# Altium footprint library NXP_60_26022015.PCBLIB: 287 footprints (part 13 of 18) (continued)
## SOT926-1 [mm]
pads (100):
  rrect100% 0.35x0.35 smd: A1(-3.6,3.6) A2(-2.8,3.6) A3(-2,3.6) A4(-1.2,3.6) A5(-0.4,3.6) A6(0.4,3.6) A7(1.2,3.6) A8(2,3.6) A9(2.8,3.6) A10(3.6,3.6) B1(-3.6,2.8) B2(-2.8,2.8) B3(-2,2.8) B4(-1.2,2.8) B5(-0.4,2.8) B6(0.4,2.8) B7(1.2,2.8) B8(2,2.8) B9(2.8,2.8) B10(3.6,2.8) C1(-3.6,2) C2(-2.8,2) C3(-2,2) C4(-1.2,2) C5(-0.4,2) C6(0.4,2) C7(1.2,2) C8(2,2) C9(2.8,2) C10(3.6,2) D1(-3.6,1.2) D2(-2.8,1.2) D3(-2,1.2) D4(-1.2,1.2) D5(-0.4,1.2) D6(0.4,1.2) D7(1.2,1.2) D8(2,1.2) D9(2.8,1.2) D10(3.6,1.2) E1(-3.6,0.4) E2(-2.8,0.4) E3(-2,0.4) E4(-1.2,0.4) E5(-0.4,0.4) E6(0.4,0.4) E7(1.2,0.4) E8(2,0.4) E9(2.8,0.4) E10(3.6,0.4) F1(-3.6,-0.4) F2(-2.8,-0.4) F3(-2,-0.4) F4(-1.2,-0.4) F5(-0.4,-0.4) F6(0.4,-0.4) F7(1.2,-0.4) F8(2,-0.4) F9(2.8,-0.4) F10(3.6,-0.4) G1(-3.6,-1.2) G2(-2.8,-1.2) G3(-2,-1.2) G4(-1.2,-1.2) G5(-0.4,-1.2) G6(0.4,-1.2) G7(1.2,-1.2) G8(2,-1.2) G9(2.8,-1.2) G10(3.6,-1.2) H1(-3.6,-2) H2(-2.8,-2) H3(-2,-2) H4(-1.2,-2) H5(-0.4,-2) H6(0.4,-2) H7(1.2,-2) H8(2,-2) H9(2.8,-2) H10(3.6,-2) J1(-3.6,-2.8) J2(-2.8,-2.8) J3(-2,-2.8) J4(-1.2,-2.8) J5(-0.4,-2.8) J6(0.4,-2.8) J7(1.2,-2.8) J8(2,-2.8) J9(2.8,-2.8) J10(3.6,-2.8) K1(-3.6,-3.6) K2(-2.8,-3.6) K3(-2,-3.6) K4(-1.2,-3.6) K5(-0.4,-3.6) K6(0.4,-3.6) K7(1.2,-3.6) K8(2,-3.6) K9(2.8,-3.6) K10(3.6,-3.6)
Top Overlay:
  lines w0.127: -5.25,4 -5.25,5.25 -4,5.25 ; -5,-5 5,-5 5,5 -5,5 -5,-5
Top Paste:
  circle w0: c0.4,-2 r0.175
  circle w0: c-0.4,-2 r0.175
  circle w0: c0.4,-1.2 r0.175
  circle w0: c-0.4,-1.2 r0.175
  circle w0: c0.4,-3.6 r0.175
  circle w0: c-0.4,-3.6 r0.175
  circle w0: c0.4,-2.8 r0.175
  circle w0: c-0.4,-2.8 r0.175
  circle w0: c-1.2,-2 r0.175
  circle w0: c-2,-2 r0.175
  circle w0: c-1.2,-1.2 r0.175
  circle w0: c-2,-1.2 r0.175
  circle w0: c-1.2,-3.6 r0.175
  circle w0: c-2,-3.6 r0.175
  circle w0: c-1.2,-2.8 r0.175
  circle w0: c-2,-2.8 r0.175
  circle w0: c3.6,-2 r0.175
  circle w0: c2.8,-2 r0.175
  circle w0: c3.6,-1.2 r0.175
  circle w0: c2.8,-1.2 r0.175
  circle w0: c3.6,-3.6 r0.175
  circle w0: c2.8,-3.6 r0.175
  circle w0: c3.6,-2.8 r0.175
  circle w0: c2.8,-2.8 r0.175
  circle w0: c2,-2 r0.175
  circle w0: c1.2,-2 r0.175
  circle w0: c2,-1.2 r0.175
  circle w0: c1.2,-1.2 r0.175
  circle w0: c2,-3.6 r0.175
  circle w0: c1.2,-3.6 r0.175
  circle w0: c2,-2.8 r0.175
  circle w0: c1.2,-2.8 r0.175
  circle w0: c-2.8,-2 r0.175
  circle w0: c-3.6,-2 r0.175
  circle w0: c-2.8,-1.2 r0.175
  circle w0: c-3.6,-1.2 r0.175
  circle w0: c-2.8,-3.6 r0.175
  circle w0: c-3.6,-3.6 r0.175
  circle w0: c-2.8,-2.8 r0.175
  circle w0: c-3.6,-2.8 r0.175
  circle w0: c0.4,1.2 r0.175
  circle w0: c-0.4,1.2 r0.175
  circle w0: c0.4,2 r0.175
  circle w0: c-0.4,2 r0.175
  circle w0: c0.4,-0.4 r0.175
  circle w0: c-0.4,-0.4 r0.175
  circle w0: c0.4,0.4 r0.175
  circle w0: c-0.4,0.4 r0.175
  circle w0: c-1.2,1.2 r0.175
  circle w0: c-2,1.2 r0.175
  circle w0: c-1.2,2 r0.175
  circle w0: c-2,2 r0.175
  circle w0: c-1.2,-0.4 r0.175
  circle w0: c-2,-0.4 r0.175
  circle w0: c-1.2,0.4 r0.175
  circle w0: c-2,0.4 r0.175
  circle w0: c3.6,1.2 r0.175
  circle w0: c2.8,1.2 r0.175
  circle w0: c3.6,2 r0.175
  circle w0: c2.8,2 r0.175
  circle w0: c3.6,-0.4 r0.175
  circle w0: c2.8,-0.4 r0.175
  circle w0: c3.6,0.4 r0.175
  circle w0: c2.8,0.4 r0.175
  circle w0: c2,1.2 r0.175
  circle w0: c1.2,1.2 r0.175
  circle w0: c2,2 r0.175
  circle w0: c1.2,2 r0.175
  circle w0: c2,-0.4 r0.175
  circle w0: c1.2,-0.4 r0.175
  circle w0: c2,0.4 r0.175
  circle w0: c1.2,0.4 r0.175
  circle w0: c-2.8,1.2 r0.175
  circle w0: c-3.6,1.2 r0.175
  circle w0: c-2.8,2 r0.175
  circle w0: c-3.6,2 r0.175
  circle w0: c-2.8,-0.4 r0.175
  circle w0: c-3.6,-0.4 r0.175
  circle w0: c-2.8,0.4 r0.175
  circle w0: c-3.6,0.4 r0.175
  circle w0: c0.4,2.8 r0.175
  circle w0: c-0.4,2.8 r0.175
  circle w0: c0.4,3.6 r0.175
  circle w0: c-0.4,3.6 r0.175
  circle w0: c-1.2,2.8 r0.175
  circle w0: c-2,2.8 r0.175
  circle w0: c-1.2,3.6 r0.175
  circle w0: c-2,3.6 r0.175
  circle w0: c3.6,2.8 r0.175
  circle w0: c2.8,2.8 r0.175
  circle w0: c3.6,3.6 r0.175
  circle w0: c2.8,3.6 r0.175
  circle w0: c2,2.8 r0.175
  circle w0: c1.2,2.8 r0.175
  circle w0: c2,3.6 r0.175
  circle w0: c1.2,3.6 r0.175
  circle w0: c-2.8,2.8 r0.175
  circle w0: c-3.6,2.8 r0.175
  circle w0: c-2.8,3.6 r0.175
  circle w0: c-3.6,3.6 r0.175
Top Solder:
  circle w0: c0.4,-2 r0.25
  circle w0: c-0.4,-2 r0.25
  circle w0: c0.4,-1.2 r0.25
  circle w0: c-0.4,-1.2 r0.25
  circle w0: c0.4,-3.6 r0.25
  circle w0: c-0.4,-3.6 r0.25
  circle w0: c0.4,-2.8 r0.25
  circle w0: c-0.4,-2.8 r0.25
  circle w0: c-1.2,-2 r0.25
  circle w0: c-2,-2 r0.25
  circle w0: c-1.2,-1.2 r0.25
  circle w0: c-2,-1.2 r0.25
  circle w0: c-1.2,-3.6 r0.25
  circle w0: c-2,-3.6 r0.25
  circle w0: c-1.2,-2.8 r0.25
  circle w0: c-2,-2.8 r0.25
  circle w0: c3.6,-2 r0.25
  circle w0: c2.8,-2 r0.25
  circle w0: c3.6,-1.2 r0.25
  circle w0: c2.8,-1.2 r0.25
  circle w0: c3.6,-3.6 r0.25
  circle w0: c2.8,-3.6 r0.25
  circle w0: c3.6,-2.8 r0.25
  circle w0: c2.8,-2.8 r0.25
  circle w0: c2,-2 r0.25
  circle w0: c1.2,-2 r0.25
  circle w0: c2,-1.2 r0.25
  circle w0: c1.2,-1.2 r0.25
  circle w0: c2,-3.6 r0.25
  circle w0: c1.2,-3.6 r0.25
  circle w0: c2,-2.8 r0.25
  circle w0: c1.2,-2.8 r0.25
  circle w0: c-2.8,-2 r0.25
  circle w0: c-3.6,-2 r0.25
  circle w0: c-2.8,-1.2 r0.25
  circle w0: c-3.6,-1.2 r0.25
  circle w0: c-2.8,-3.6 r0.25
  circle w0: c-3.6,-3.6 r0.25
  circle w0: c-2.8,-2.8 r0.25
  circle w0: c-3.6,-2.8 r0.25
  circle w0: c0.4,1.2 r0.25
  circle w0: c-0.4,1.2 r0.25
  circle w0: c0.4,2 r0.25
  circle w0: c-0.4,2 r0.25
  circle w0: c0.4,-0.4 r0.25
  circle w0: c-0.4,-0.4 r0.25
  circle w0: c0.4,0.4 r0.25
  circle w0: c-0.4,0.4 r0.25
  circle w0: c-1.2,1.2 r0.25
  circle w0: c-2,1.2 r0.25
  circle w0: c-1.2,2 r0.25
  circle w0: c-2,2 r0.25
  circle w0: c-1.2,-0.4 r0.25
  circle w0: c-2,-0.4 r0.25
  circle w0: c-1.2,0.4 r0.25
  circle w0: c-2,0.4 r0.25
  circle w0: c3.6,1.2 r0.25
  circle w0: c2.8,1.2 r0.25
  circle w0: c3.6,2 r0.25
  circle w0: c2.8,2 r0.25
  circle w0: c3.6,-0.4 r0.25
  circle w0: c2.8,-0.4 r0.25
  circle w0: c3.6,0.4 r0.25
  circle w0: c2.8,0.4 r0.25
  circle w0: c2,1.2 r0.25
  circle w0: c1.2,1.2 r0.25
  circle w0: c2,2 r0.25
  circle w0: c1.2,2 r0.25
  circle w0: c2,-0.4 r0.25
  circle w0: c1.2,-0.4 r0.25
  circle w0: c2,0.4 r0.25
  circle w0: c1.2,0.4 r0.25
  circle w0: c-2.8,1.2 r0.25
  circle w0: c-3.6,1.2 r0.25
  circle w0: c-2.8,2 r0.25
  circle w0: c-3.6,2 r0.25
  circle w0: c-2.8,-0.4 r0.25
  circle w0: c-3.6,-0.4 r0.25
  circle w0: c-2.8,0.4 r0.25
  circle w0: c-3.6,0.4 r0.25
  circle w0: c0.4,2.8 r0.25
  circle w0: c-0.4,2.8 r0.25
  circle w0: c0.4,3.6 r0.25
  circle w0: c-0.4,3.6 r0.25
  circle w0: c-1.2,2.8 r0.25
  circle w0: c-2,2.8 r0.25
  circle w0: c-1.2,3.6 r0.25
  circle w0: c-2,3.6 r0.25
  circle w0: c3.6,2.8 r0.25
  circle w0: c2.8,2.8 r0.25
  circle w0: c3.6,3.6 r0.25
  circle w0: c2.8,3.6 r0.25
  circle w0: c2,2.8 r0.25
  circle w0: c1.2,2.8 r0.25
  circle w0: c2,3.6 r0.25
  circle w0: c1.2,3.6 r0.25
  circle w0: c-2.8,2.8 r0.25
  circle w0: c-3.6,2.8 r0.25
  circle w0: c-2.8,3.6 r0.25
  circle w0: c-3.6,3.6 r0.25

## SOT950-1 [mm]
pads (208):
  rrect100% 0.475x0.475 smd: A1(-6.4,6.4) A2(-5.6,6.4) A3(-4.8,6.4) A4(-4,6.4) A5(-3.2,6.4) A6(-2.4,6.4) A7(-1.6,6.4) A8(-0.8,6.4) A9(0,6.4) A10(0.8,6.4) A11(1.6,6.4) A12(2.4,6.4) A13(3.2,6.4) A14(4,6.4) A15(4.8,6.4) A16(5.6,6.4) A17(6.4,6.4) B1(-6.4,5.6) B2(-5.6,5.6) B3(-4.8,5.6) B4(-4,5.6) B5(-3.2,5.6) B6(-2.4,5.6) B7(-1.6,5.6) B8(-0.8,5.6) B9(0,5.6) B10(0.8,5.6) B11(1.6,5.6) B12(2.4,5.6) B13(3.2,5.6) B14(4,5.6) B15(4.8,5.6) B16(5.6,5.6) B17(6.4,5.6) C1(-6.4,4.8) C2(-5.6,4.8) C3(-4.8,4.8) C4(-4,4.8) C5(-3.2,4.8) C6(-2.4,4.8) C7(-1.6,4.8) C8(-0.8,4.8) C9(0,4.8) C10(0.8,4.8) C11(1.6,4.8) C12(2.4,4.8) C13(3.2,4.8) C14(4,4.8) C15(4.8,4.8) C16(5.6,4.8) C17(6.4,4.8) D1(-6.4,4) D2(-5.6,4) D3(-4.8,4) D4(-4,4) D5(-3.2,4) D6(-2.4,4) D7(-1.6,4) D8(-0.8,4) D9(0,4) D10(0.8,4) D11(1.6,4) D12(2.4,4) D13(3.2,4) D14(4,4) D15(4.8,4) D16(5.6,4) D17(6.4,4) E1(-6.4,3.2) E2(-5.6,3.2) E3(-4.8,3.2) E4(-4,3.2) E14(4,3.2) E15(4.8,3.2) E16(5.6,3.2) E17(6.4,3.2) F1(-6.4,2.4) F2(-5.6,2.4) F3(-4.8,2.4) F4(-4,2.4) F14(4,2.4) F15(4.8,2.4) F16(5.6,2.4) F17(6.4,2.4) G1(-6.4,1.6) G2(-5.6,1.6) G3(-4.8,1.6) G4(-4,1.6) G14(4,1.6) G15(4.8,1.6) G16(5.6,1.6) G17(6.4,1.6) H1(-6.4,0.8) H2(-5.6,0.8) H3(-4.8,0.8) H4(-4,0.8) H14(4,0.8) H15(4.8,0.8) H16(5.6,0.8) H17(6.4,0.8) J1(-6.4,0) J2(-5.6,0) J3(-4.8,0) J4(-4,0) J14(4,0) J15(4.8,0) J16(5.6,0) J17(6.4,0) K1(-6.4,-0.8) K2(-5.6,-0.8) K3(-4.8,-0.8) K4(-4,-0.8) K14(4,-0.8) K15(4.8,-0.8) K16(5.6,-0.8) K17(6.4,-0.8) L1(-6.4,-1.6) L2(-5.6,-1.6) L3(-4.8,-1.6) L4(-4,-1.6) L14(4,-1.6) L15(4.8,-1.6) L16(5.6,-1.6) L17(6.4,-1.6) M1(-6.4,-2.4) M2(-5.6,-2.4) M3(-4.8,-2.4) M4(-4,-2.4) M14(4,-2.4) M15(4.8,-2.4) M16(5.6,-2.4) M17(6.4,-2.4) N1(-6.4,-3.2) N2(-5.6,-3.2) N3(-4.8,-3.2) N4(-4,-3.2) N14(4,-3.2) N15(4.8,-3.2) N16(5.6,-3.2) N17(6.4,-3.2) P1(-6.4,-4) P2(-5.6,-4) P3(-4.8,-4) P4(-4,-4) P5(-3.2,-4) P6(-2.4,-4) P7(-1.6,-4) P8(-0.8,-4) P9(0,-4) P10(0.8,-4) P11(1.6,-4) P12(2.4,-4) P13(3.2,-4) P14(4,-4) P15(4.8,-4) P16(5.6,-4) P17(6.4,-4) R1(-6.4,-4.8) R2(-5.6,-4.8) R3(-4.8,-4.8) R4(-4,-4.8) R5(-3.2,-4.8) R6(-2.4,-4.8) R7(-1.6,-4.8) R8(-0.8,-4.8) R9(0,-4.8) R10(0.8,-4.8) R11(1.6,-4.8) R12(2.4,-4.8) R13(3.2,-4.8) R14(4,-4.8) R15(4.8,-4.8) R16(5.6,-4.8) R17(6.4,-4.8) T1(-6.4,-5.6) T2(-5.6,-5.6) T3(-4.8,-5.6) T4(-4,-5.6) T5(-3.2,-5.6) T6(-2.4,-5.6) T7(-1.6,-5.6) T8(-0.8,-5.6) T9(0,-5.6) T10(0.8,-5.6) T11(1.6,-5.6) T12(2.4,-5.6) T13(3.2,-5.6) T14(4,-5.6) T15(4.8,-5.6) T16(5.6,-5.6) T17(6.4,-5.6) U1(-6.4,-6.4) U2(-5.6,-6.4) U3(-4.8,-6.4) U4(-4,-6.4) U5(-3.2,-6.4) U6(-2.4,-6.4) U7(-1.6,-6.4) U8(-0.8,-6.4) U9(0,-6.4) U10(0.8,-6.4) U11(1.6,-6.4) U12(2.4,-6.4) U13(3.2,-6.4) U14(4,-6.4) U15(4.8,-6.4) U16(5.6,-6.4) U17(6.4,-6.4)
Top Overlay:
  lines w0.127: -7.79,6.54 -7.79,7.79 -6.54,7.79
  lines w0.203: -7.5,-7.5 7.5,-7.5 7.5,7.5 -7.5,7.5 -7.5,-7.5
Top Paste:
  drawing of 208 lines, arcs and shapes, not listed
Top Solder:
  drawing of 208 lines, arcs and shapes, not listed

## SOT962-1/2/3 [mm]
pads (64):
  rrect100% 0.275x0.275 smd: A1(-1.75,1.75) A2(-1.25,1.75) A3(-0.75,1.75) A4(-0.25,1.75) A5(0.25,1.75) A6(0.75,1.75) A7(1.25,1.75) A8(1.75,1.75) B1(-1.75,1.25) B2(-1.25,1.25) B3(-0.75,1.25) B4(-0.25,1.25) B5(0.25,1.25) B6(0.75,1.25) B7(1.25,1.25) B8(1.75,1.25) C1(-1.75,0.75) C2(-1.25,0.75) C3(-0.75,0.75) C4(-0.25,0.75) C5(0.25,0.75) C6(0.75,0.75) C7(1.25,0.75) C8(1.75,0.75) D1(-1.75,0.25) D2(-1.25,0.25) D3(-0.75,0.25) D4(-0.25,0.25) D5(0.25,0.25) D6(0.75,0.25) D7(1.25,0.25) D8(1.75,0.25) E1(-1.75,-0.25) E2(-1.25,-0.25) E3(-0.75,-0.25) E4(-0.25,-0.25) E5(0.25,-0.25) E6(0.75,-0.25) E7(1.25,-0.25) E8(1.75,-0.25) F1(-1.75,-0.75) F2(-1.25,-0.75) F3(-0.75,-0.75) F4(-0.25,-0.75) F5(0.25,-0.75) F6(0.75,-0.75) F7(1.25,-0.75) F8(1.75,-0.75) G1(-1.75,-1.25) G2(-1.25,-1.25) G3(-0.75,-1.25) G4(-0.25,-1.25) G5(0.25,-1.25) G6(0.75,-1.25) G7(1.25,-1.25) G8(1.75,-1.25) H1(-1.75,-1.75) H2(-1.25,-1.75) H3(-0.75,-1.75) H4(-0.25,-1.75) H5(0.25,-1.75) H6(0.75,-1.75) H7(1.25,-1.75) H8(1.75,-1.75)
Top Overlay:
  lines w0.127: -2.5,1.5 -2.5,2.5 -1.5,2.5 ; -2.25,-2.25 -2.25,2.25 2.25,2.25 2.25,-2.25 -2.25,-2.25
Top Paste:
  rectangle: -1.9,1.6 -1.6,1.9
  rectangle: -1.9,1.1 -1.6,1.4
  rectangle: -1.9,0.6 -1.6,0.9
  rectangle: -1.9,0.1 -1.6,0.4
  rectangle: -1.9,-0.4 -1.6,-0.1
  rectangle: -1.9,-0.9 -1.6,-0.6
  rectangle: -1.9,-1.4 -1.6,-1.1
  rectangle: -1.9,-1.9 -1.6,-1.6
  rectangle: -1.4,1.6 -1.1,1.9
  rectangle: -1.4,1.1 -1.1,1.4
  rectangle: -1.4,0.6 -1.1,0.9
  rectangle: -1.4,0.1 -1.1,0.4
  rectangle: -1.4,-0.4 -1.1,-0.1
  rectangle: -1.4,-0.9 -1.1,-0.6
  rectangle: -1.4,-1.4 -1.1,-1.1
  rectangle: -1.4,-1.9 -1.1,-1.6
  rectangle: -0.9,1.6 -0.6,1.9
  rectangle: -0.9,1.1 -0.6,1.4
  rectangle: -0.9,0.6 -0.6,0.9
  rectangle: -0.9,0.1 -0.6,0.4
  rectangle: -0.9,-0.4 -0.6,-0.1
  rectangle: -0.4,1.6 -0.1,1.9
  rectangle: -0.4,1.1 -0.1,1.4
  rectangle: -0.4,0.6 -0.1,0.9
  rectangle: -0.4,0.1 -0.1,0.4
  rectangle: 0.1,1.6 0.4,1.9
  rectangle: 0.1,1.1 0.4,1.4
  rectangle: 0.1,0.6 0.4,0.9
  rectangle: 0.1,0.1 0.4,0.4
  rectangle: -0.4,-0.4 -0.1,-0.1
  rectangle: 0.1,-0.4 0.4,-0.1
  rectangle: -0.9,-0.9 -0.6,-0.6
  rectangle: -0.9,-1.4 -0.6,-1.1
  rectangle: -0.9,-1.9 -0.6,-1.6
  rectangle: -0.4,-0.9 -0.1,-0.6
  rectangle: -0.4,-1.4 -0.1,-1.1
  rectangle: -0.4,-1.9 -0.1,-1.6
  rectangle: 0.1,-0.9 0.4,-0.6
  rectangle: 0.1,-1.4 0.4,-1.1
  rectangle: 0.1,-1.9 0.4,-1.6
  rectangle: 0.6,1.6 0.9,1.9
  rectangle: 0.6,1.1 0.9,1.4
  rectangle: 0.6,0.6 0.9,0.9
  rectangle: 0.6,0.1 0.9,0.4
  rectangle: 0.6,-0.4 0.9,-0.1
  rectangle: 0.6,-0.9 0.9,-0.6
  rectangle: 0.6,-1.4 0.9,-1.1
  rectangle: 0.6,-1.9 0.9,-1.6
  rectangle: 1.1,1.6 1.4,1.9
  rectangle: 1.1,1.1 1.4,1.4
  rectangle: 1.1,0.6 1.4,0.9
  rectangle: 1.1,0.1 1.4,0.4
  rectangle: 1.1,-0.4 1.4,-0.1
  rectangle: 1.1,-0.9 1.4,-0.6
  rectangle: 1.1,-1.4 1.4,-1.1
  rectangle: 1.1,-1.9 1.4,-1.6
  rectangle: 1.6,1.6 1.9,1.9
  rectangle: 1.6,1.1 1.9,1.4
  rectangle: 1.6,0.6 1.9,0.9
  rectangle: 1.6,0.1 1.9,0.4
  rectangle: 1.6,-0.4 1.9,-0.1
  rectangle: 1.6,-0.9 1.9,-0.6
  rectangle: 1.6,-1.4 1.9,-1.1
  rectangle: 1.6,-1.9 1.9,-1.6
Top Solder:
  circle w0: c-1.75,1.75 r0.213
  circle w0: c-1.75,1.25 r0.213
  circle w0: c-1.75,0.75 r0.213
  circle w0: c-1.75,0.25 r0.213
  circle w0: c-1.75,-0.25 r0.213
  circle w0: c-1.75,-0.75 r0.213
  circle w0: c-1.75,-1.25 r0.213
  circle w0: c-1.75,-1.75 r0.213
  circle w0: c-1.25,1.75 r0.213
  circle w0: c-1.25,1.25 r0.213
  circle w0: c-1.25,0.75 r0.213
  circle w0: c-1.25,0.25 r0.213
  circle w0: c-1.25,-0.25 r0.213
  circle w0: c-1.25,-0.75 r0.213
  circle w0: c-1.25,-1.25 r0.213
  circle w0: c-1.25,-1.75 r0.213
  circle w0: c-0.75,1.75 r0.213
  circle w0: c-0.75,1.25 r0.213
  circle w0: c-0.75,0.75 r0.213
  circle w0: c-0.75,0.25 r0.213
  circle w0: c-0.75,-0.25 r0.213
  circle w0: c-0.25,1.75 r0.213
  circle w0: c-0.25,1.25 r0.213
  circle w0: c-0.25,0.75 r0.213
  circle w0: c-0.25,0.25 r0.213
  circle w0: c0.25,1.75 r0.213
  circle w0: c0.25,1.25 r0.213
  circle w0: c0.25,0.75 r0.213
  circle w0: c0.25,0.25 r0.213
  circle w0: c-0.25,-0.25 r0.213
  circle w0: c0.25,-0.25 r0.213
  circle w0: c-0.75,-0.75 r0.213
  circle w0: c-0.75,-1.25 r0.213
  circle w0: c-0.75,-1.75 r0.213
  circle w0: c-0.25,-0.75 r0.213
  circle w0: c-0.25,-1.25 r0.213
  circle w0: c-0.25,-1.75 r0.213
  circle w0: c0.25,-0.75 r0.213
  circle w0: c0.25,-1.25 r0.213
  circle w0: c0.25,-1.75 r0.213
  circle w0: c0.75,1.75 r0.213
  circle w0: c0.75,1.25 r0.213
  circle w0: c0.75,0.75 r0.213
  circle w0: c0.75,0.25 r0.213
  circle w0: c0.75,-0.25 r0.213
  circle w0: c0.75,-0.75 r0.213
  circle w0: c0.75,-1.25 r0.213
  circle w0: c0.75,-1.75 r0.213
  circle w0: c1.25,1.75 r0.213
  circle w0: c1.25,1.25 r0.213
  circle w0: c1.25,0.75 r0.213
  circle w0: c1.25,0.25 r0.213
  circle w0: c1.25,-0.25 r0.213
  circle w0: c1.25,-0.75 r0.213
  circle w0: c1.25,-1.25 r0.213
  circle w0: c1.25,-1.75 r0.213
  circle w0: c1.75,1.75 r0.213
  circle w0: c1.75,1.25 r0.213
  circle w0: c1.75,0.75 r0.213
  circle w0: c1.75,0.25 r0.213
  circle w0: c1.75,-0.25 r0.213
  circle w0: c1.75,-0.75 r0.213
  circle w0: c1.75,-1.25 r0.213
  circle w0: c1.75,-1.75 r0.213

## SOT965-1 [mm]
pads (516):
  rrect100% 0.275x0.275 smd: A1(-6.25,6.25) A2(-5.75,6.25) A3(-5.25,6.25) A4(-4.75,6.25) A5(-4.25,6.25) A6(-3.75,6.25) A7(-3.25,6.25) A8(-2.75,6.25) A9(-2.25,6.25) A10(-1.75,6.25) A11(-1.25,6.25) A12(-0.75,6.25) A13(-0.25,6.25) A14(0.25,6.25) A15(0.75,6.25) A16(1.25,6.25) A17(1.75,6.25) A18(2.25,6.25) A19(2.75,6.25) A20(3.25,6.25) A21(3.75,6.25) A22(4.25,6.25) A23(4.75,6.25) A24(5.25,6.25) A25(5.75,6.25) A26(6.25,6.25) AA1(-6.25,-3.75) AA2(-5.75,-3.75) AA3(-5.25,-3.75) AA4(-4.75,-3.75) AA5(-4.25,-3.75) AA22(4.25,-3.75) AA23(4.75,-3.75) AA24(5.25,-3.75) AA25(5.75,-3.75) AA26(6.25,-3.75) AB1(-6.25,-4.25) AB2(-5.75,-4.25) AB3(-5.25,-4.25) AB4(-4.75,-4.25) AB5(-4.25,-4.25) AB6(-3.75,-4.25) AB7(-3.25,-4.25) AB8(-2.75,-4.25) AB9(-2.25,-4.25) AB10(-1.75,-4.25) AB11(-1.25,-4.25) AB12(-0.75,-4.25) AB13(-0.25,-4.25) AB14(0.25,-4.25) AB15(0.75,-4.25) AB16(1.25,-4.25) AB17(1.75,-4.25) AB18(2.25,-4.25) AB19(2.75,-4.25) AB20(3.25,-4.25) AB21(3.75,-4.25) AB22(4.25,-4.25) AB23(4.75,-4.25) AB24(5.25,-4.25) AB25(5.75,-4.25) AB26(6.25,-4.25) AC1(-6.25,-4.75) AC2(-5.75,-4.75) AC3(-5.25,-4.75) AC4(-4.75,-4.75) AC5(-4.25,-4.75) AC6(-3.75,-4.75) AC7(-3.25,-4.75) AC8(-2.75,-4.75) AC9(-2.25,-4.75) AC10(-1.75,-4.75) AC11(-1.25,-4.75) AC12(-0.75,-4.75) AC13(-0.25,-4.75) AC14(0.25,-4.75) AC15(0.75,-4.75) AC16(1.25,-4.75) AC17(1.75,-4.75) AC18(2.25,-4.75) AC19(2.75,-4.75) AC20(3.25,-4.75) AC21(3.75,-4.75) AC22(4.25,-4.75) AC23(4.75,-4.75) AC24(5.25,-4.75) AC25(5.75,-4.75) AC26(6.25,-4.75) AD1(-6.25,-5.25) AD2(-5.75,-5.25) AD3(-5.25,-5.25) AD4(-4.75,-5.25) AD5(-4.25,-5.25) AD6(-3.75,-5.25) AD7(-3.25,-5.25) AD8(-2.75,-5.25) AD9(-2.25,-5.25) AD10(-1.75,-5.25) AD11(-1.25,-5.25) AD12(-0.75,-5.25) AD13(-0.25,-5.25) AD14(0.25,-5.25) AD15(0.75,-5.25) AD16(1.25,-5.25) AD17(1.75,-5.25) AD18(2.25,-5.25) AD19(2.75,-5.25) AD20(3.25,-5.25) AD21(3.75,-5.25) AD22(4.25,-5.25) AD23(4.75,-5.25) AD24(5.25,-5.25) AD25(5.75,-5.25) AD26(6.25,-5.25) AE1(-6.25,-5.75) AE2(-5.75,-5.75) AE3(-5.25,-5.75) AE4(-4.75,-5.75) AE5(-4.25,-5.75) AE6(-3.75,-5.75) AE7(-3.25,-5.75) AE8(-2.75,-5.75) AE9(-2.25,-5.75) AE10(-1.75,-5.75) AE11(-1.25,-5.75) AE12(-0.75,-5.75) AE13(-0.25,-5.75) AE14(0.25,-5.75) AE15(0.75,-5.75) AE16(1.25,-5.75) AE17(1.75,-5.75) AE18(2.25,-5.75) AE19(2.75,-5.75) AE20(3.25,-5.75) AE21(3.75,-5.75) AE22(4.25,-5.75) AE23(4.75,-5.75) AE24(5.25,-5.75) AE25(5.75,-5.75) AE26(6.25,-5.75) AF1(-6.25,-6.25) AF2(-5.75,-6.25) AF3(-5.25,-6.25) AF4(-4.75,-6.25) AF5(-4.25,-6.25) AF6(-3.75,-6.25) AF7(-3.25,-6.25) AF8(-2.75,-6.25) AF9(-2.25,-6.25) AF10(-1.75,-6.25) AF11(-1.25,-6.25) AF12(-0.75,-6.25) AF13(-0.25,-6.25) AF14(0.25,-6.25) AF15(0.75,-6.25) AF16(1.25,-6.25) AF17(1.75,-6.25) AF18(2.25,-6.25) AF19(2.75,-6.25) AF20(3.25,-6.25) AF21(3.75,-6.25) AF22(4.25,-6.25) AF23(4.75,-6.25) AF24(5.25,-6.25) AF25(5.75,-6.25) AF26(6.25,-6.25) B1(-6.25,5.75) B2(-5.75,5.75) B3(-5.25,5.75) B4(-4.75,5.75) B5(-4.25,5.75) B6(-3.75,5.75) B7(-3.25,5.75) B8(-2.75,5.75) B9(-2.25,5.75) B10(-1.75,5.75) B11(-1.25,5.75) B12(-0.75,5.75) B13(-0.25,5.75) B14(0.25,5.75) B15(0.75,5.75) B16(1.25,5.75) B17(1.75,5.75) B18(2.25,5.75) B19(2.75,5.75) B20(3.25,5.75) B21(3.75,5.75) B22(4.25,5.75) B23(4.75,5.75) B24(5.25,5.75) B25(5.75,5.75) B26(6.25,5.75) C1(-6.25,5.25) C2(-5.75,5.25) C3(-5.25,5.25) C4(-4.75,5.25) C5(-4.25,5.25) C6(-3.75,5.25) C7(-3.25,5.25) C8(-2.75,5.25) C9(-2.25,5.25) C10(-1.75,5.25) C11(-1.25,5.25) C12(-0.75,5.25) C13(-0.25,5.25) C14(0.25,5.25) C15(0.75,5.25) C16(1.25,5.25) C17(1.75,5.25) C18(2.25,5.25) C19(2.75,5.25) C20(3.25,5.25) C21(3.75,5.25) C22(4.25,5.25) C23(4.75,5.25) C24(5.25,5.25) C25(5.75,5.25) C26(6.25,5.25) D1(-6.25,4.75) D2(-5.75,4.75) D3(-5.25,4.75) D4(-4.75,4.75) D5(-4.25,4.75) D6(-3.75,4.75) D7(-3.25,4.75) D8(-2.75,4.75) D9(-2.25,4.75) D10(-1.75,4.75) D11(-1.25,4.75) D12(-0.75,4.75) D13(-0.25,4.75) D14(0.25,4.75) D15(0.75,4.75) D16(1.25,4.75) D17(1.75,4.75) D18(2.25,4.75) D19(2.75,4.75) D20(3.25,4.75) D21(3.75,4.75) D22(4.25,4.75) D23(4.75,4.75) D24(5.25,4.75) D25(5.75,4.75) D26(6.25,4.75) E1(-6.25,4.25) E2(-5.75,4.25) E3(-5.25,4.25) E4(-4.75,4.25) E5(-4.25,4.25) E6(-3.75,4.25) E7(-3.25,4.25) E8(-2.75,4.25) E9(-2.25,4.25) E10(-1.75,4.25) E11(-1.25,4.25) E12(-0.75,4.25) E13(-0.25,4.25) E14(0.25,4.25) E15(0.75,4.25) E16(1.25,4.25) E17(1.75,4.25) E18(2.25,4.25) E19(2.75,4.25) E20(5.25,4.25) E21(5.75,4.25) E22(6.25,4.25) E23(3.25,4.25) E24(3.75,4.25) E25(4.25,4.25) E26(4.75,4.25) F1(-6.25,3.75) F2(-5.75,3.75) F3(-5.25,3.75) F4(-4.75,3.75) F5(-4.25,3.75) F22(4.25,3.75) F23(4.75,3.75) F24(5.25,3.75) F25(5.75,3.75) F26(6.25,3.75) G1(-6.25,3.25) G2(-5.75,3.25) G3(-5.25,3.25) G4(-4.75,3.25) G5(-4.25,3.25) G22(4.25,3.25) G23(4.75,3.25) G24(5.25,3.25) G25(5.75,3.25) G26(6.25,3.25) H1(-6.25,2.75) H2(-5.75,2.75) H3(-5.25,2.75) H4(-4.75,2.75) H5(-4.25,2.75) H8(-2.75,2.75) H9(-2.25,2.75) H10(-1.75,2.75) H11(-1.25,2.75) H12(-0.75,2.75) H13(-0.25,2.75) H14(0.25,2.75) H15(0.75,2.75) H16(1.25,2.75) H17(1.75,2.75) H18(2.25,2.75) H19(2.75,2.75) H22(4.25,2.75) H23(4.75,2.75) H24(5.25,2.75) H25(5.75,2.75) H26(6.25,2.75) J1(-6.25,2.25) J2(-5.75,2.25) J3(-5.25,2.25) J4(-4.75,2.25) J5(-4.25,2.25) J8(-2.75,2.25) J9(-2.25,2.25) J10(-1.75,2.25) J11(-1.25,2.25) J12(-0.75,2.25) J13(-0.25,2.25) J14(0.25,2.25) J15(0.75,2.25) J16(1.25,2.25) J17(1.75,2.25) J18(2.25,2.25) J19(2.75,2.25) J22(4.25,2.25) J23(4.75,2.25) J24(5.25,2.25) J25(5.75,2.25) J26(6.25,2.25) K1(-6.25,1.75) K2(-5.75,1.75) K3(-5.25,1.75) K4(-4.75,1.75) K5(-4.25,1.75) K8(-2.75,1.75) K9(-2.25,1.75) K18(2.25,1.75) K19(2.75,1.75) K22(4.25,1.75) K23(4.75,1.75) K24(5.25,1.75) K25(5.75,1.75) K26(6.25,1.75) L1(-6.25,1.25) L2(-5.75,1.25) L3(-5.25,1.25) L4(-4.75,1.25) L5(-4.25,1.25) L8(-2.75,1.25) L9(-2.25,1.25) L18(2.25,1.25) L19(2.75,1.25) L22(4.25,1.25) L23(4.75,1.25) L24(5.25,1.25) L25(5.75,1.25) L26(6.25,1.25) M1(-6.25,0.75) M2(-5.75,0.75) M3(-5.25,0.75) M4(-4.75,0.75) M5(-4.25,0.75) M8(-2.75,0.75) M9(-2.25,0.75) M12(-0.75,0.75) M13(-0.25,0.75) M14(0.25,0.75) M15(0.75,0.75) M18(2.25,0.75) M19(2.75,0.75) M22(4.25,0.75) M23(4.75,0.75) M24(5.25,0.75) M25(5.75,0.75) M26(6.25,0.75) N1(-6.25,0.25) N2(-5.75,0.25) N3(-5.25,0.25) N4(-4.75,0.25) N5(-4.25,0.25) N8(-2.75,0.25) N9(-2.25,0.25) N12(-0.75,0.25) N13(-0.25,0.25) N14(0.25,0.25) N15(0.75,0.25) N18(2.25,0.25) N19(2.75,0.25) N22(4.25,0.25) N23(4.75,0.25) N24(5.25,0.25) N25(5.75,0.25) N26(6.25,0.25) P1(-6.25,-0.25) P2(-5.75,-0.25) P3(-5.25,-0.25) P4(-4.75,-0.25) P5(-4.25,-0.25) P8(-2.75,-0.25) P9(-2.25,-0.25) P12(-0.75,-0.25) P13(-0.25,-0.25) P14(0.25,-0.25) P15(0.75,-0.25) P18(2.25,-0.25) P19(2.75,-0.25) P22(4.25,-0.25) P23(4.75,-0.25) P24(5.25,-0.25) P25(5.75,-0.25) P26(6.25,-0.25) R1(-6.25,-0.75) R2(-5.75,-0.75) R3(-5.25,-0.75) R4(-4.75,-0.75) R5(-4.25,-0.75) R8(-2.75,-0.75) R9(-2.25,-0.75) R12(-0.75,-0.75) R13(-0.25,-0.75) R14(0.25,-0.75) R15(0.75,-0.75) R18(2.25,-0.75) R19(2.75,-0.75) R22(4.25,-0.75) R23(4.75,-0.75) R24(5.25,-0.75) R25(5.75,-0.75) R26(6.25,-0.75) T1(-6.25,-1.25) T2(-5.75,-1.25) T3(-5.25,-1.25) T4(-4.75,-1.25) T5(-4.25,-1.25) T8(-2.75,-1.25) T9(-2.25,-1.25) T18(2.25,-1.25) T19(2.75,-1.25) T22(4.25,-1.25) T23(4.75,-1.25) T24(5.25,-1.25) T25(5.75,-1.25) T26(6.25,-1.25) U1(-6.25,-1.75) U2(-5.75,-1.75) U3(-5.25,-1.75) U4(-4.75,-1.75) U5(-4.25,-1.75) U8(-2.75,-1.75) U9(-2.25,-1.75) U18(2.25,-1.75) U19(2.75,-1.75) U22(4.25,-1.75) U23(4.75,-1.75) U24(5.25,-1.75) U25(5.75,-1.75) U26(6.25,-1.75) V1(-6.25,-2.25) V2(-5.75,-2.25) V3(-5.25,-2.25) V4(-4.75,-2.25) V5(-4.25,-2.25) V8(-2.75,-2.25) V9(-2.25,-2.25) V10(-1.75,-2.25) V11(-1.25,-2.25) V12(-0.75,-2.25) V13(-0.25,-2.25) V14(0.25,-2.25) V15(0.75,-2.25) V16(1.25,-2.25) V17(1.75,-2.25) V18(2.25,-2.25) V19(2.75,-2.25) V22(4.25,-2.25) V23(4.75,-2.25) V24(5.25,-2.25) V25(5.75,-2.25) V26(6.25,-2.25) W1(-6.25,-2.75) W2(-5.75,-2.75) W3(-5.25,-2.75) W4(-4.75,-2.75) W5(-4.25,-2.75) W8(-2.75,-2.75) W9(-2.25,-2.75) W10(-1.75,-2.75) W11(-1.25,-2.75) W12(-0.75,-2.75) W13(-0.25,-2.75) W14(0.25,-2.75) W15(0.75,-2.75) W16(1.25,-2.75) W17(1.75,-2.75) W18(2.25,-2.75) W19(2.75,-2.75) W22(4.25,-2.75) W23(4.75,-2.75) W24(5.25,-2.75) W25(5.75,-2.75) W26(6.25,-2.75) Y1(-6.25,-3.25) Y2(-5.75,-3.25) Y3(-5.25,-3.25) Y4(-4.75,-3.25) Y5(-4.25,-3.25) Y22(4.25,-3.25) Y23(4.75,-3.25) Y24(5.25,-3.25) Y25(5.75,-3.25) Y26(6.25,-3.25)
Top Overlay:
  lines w0.127: -7.25,6.25 -7.25,7.25 -6.25,7.25 ; -7,-7 -7,7 7,7 7,-7 -7,-7
Top Paste:
  drawing of 516 lines, arcs and shapes, not listed
Top Solder:
  drawing of 516 lines, arcs and shapes, not listed

## SOT972-2 [mm]
pads (9):
  rect 0.22x0.5 smd: 1(-0.6,-0.64) 2(-0.2,-0.64) 3(0.2,-0.64) 4(0.6,-0.64) 5(0.6,0.64) 6(0.2,0.64) 7(-0.2,0.64) 8(-0.6,0.64)
  rect 1.4x0.4 smd: CP(0,0)
Top Overlay:
  circle w0: c-1,-1 r0.15
Top Paste:
  rectangle: -0.25,-0.15 0.25,0.15
Top Solder:
  rectangle: -0.76,-0.94 0.76,-0.34
  rectangle: -0.76,0.34 0.76,0.94
  rectangle: -0.75,-0.25 0.75,0.25
Mechanical 16:
  rectangle: -0.85,-0.7 0,0
  lines w0.127: -0.85,-0.7 -0.85,0.7 0.85,0.7 0.85,-0.7 -0.85,-0.7

## SOT973-2 [mm]
pads (13):
  rect 0.22x0.5 smd: 1(-1,-0.64) 2(-0.6,-0.64) 3(-0.2,-0.64) 4(0.2,-0.64) 5(0.6,-0.64) 6(1,-0.64) 7(1,0.64) 8(0.6,0.64) 9(0.2,0.64) 10(-0.2,0.64) 11(-0.6,0.64) 12(-1,0.64)
  rect 2.2x0.4 smd: CP(0,0)
Top Overlay:
  circle w0: c-1.4,-1 r0.15
Top Paste:
  rectangle: -0.75,-0.15 -0.35,0.15
  rectangle: 0.35,-0.15 0.75,0.15
Top Solder:
  rectangle: -1.16,-0.94 1.16,-0.34
  rectangle: -1.16,0.34 1.16,0.94
  rectangle: -1.15,-0.25 1.15,0.25
Mechanical 16:
  rectangle: -1.25,-0.7 0,0
  lines w0.127: -1.25,-0.7 -1.25,0.7 1.25,0.7 1.25,-0.7 -1.25,-0.7

## SOT974-2 [mm]
pads (17):
  rect 0.22x0.5 smd: 1(-1.4,-0.64) 2(-1,-0.64) 3(-0.6,-0.64) 4(-0.2,-0.64) 5(0.2,-0.64) 6(0.6,-0.64) 7(1,-0.64) 8(1.4,-0.64) 9(1.4,0.64) 10(1,0.64) 11(0.6,0.64) 12(0.2,0.64) 13(-0.2,0.64) 14(-0.6,0.64) 15(-1,0.64) 16(-1.4,0.64)
  rect 3x0.4 smd: CP(0,0)
Top Overlay:
  circle w0: c-1.8,-1 r0.15
Top Paste:
  rectangle: -0.175,-0.15 0.175,0.15
  rectangle: -1.175,-0.15 -0.825,0.15
  rectangle: 0.825,-0.15 1.175,0.15
Top Solder:
  rectangle: -1.56,-0.94 1.56,-0.34
  rectangle: -1.56,0.34 1.56,0.94
  rectangle: -1.55,-0.25 1.55,0.25
Mechanical 16:
  rectangle: -1.65,-0.7 0,0
  lines w0.127: -1.65,-0.7 -1.65,0.7 1.65,0.7 1.65,-0.7 -1.65,-0.7

## SOT983-1 [mm]
pads (9):
  rect 0.22x0.5 smd: 1(-0.6,-0.64) 2(-0.2,-0.64) 3(0.2,-0.64) 4(0.6,-0.64) 5(0.6,0.64) 6(0.2,0.64) 7(-0.2,0.64) 8(-0.6,0.64)
  rect 1.4x0.4 smd: CP(0,0)
Top Overlay:
  circle w0: c-1,-1 r0.15
Top Paste:
  rectangle: -0.25,-0.15 0.25,0.15
Top Solder:
  rectangle: -0.76,-0.94 0.76,-0.34
  rectangle: -0.76,0.34 0.76,0.94
  rectangle: -0.75,-0.25 0.75,0.25
Mechanical 16:
  rectangle: -0.85,-0.7 0,0
  lines w0.127: -0.85,-0.7 -0.85,0.7 0.85,0.7 0.85,-0.7 -0.85,-0.7

## SOT984-1 [mm]
pads (13):
  rect 0.22x0.5 smd: 1(-1,-0.64) 2(-0.6,-0.64) 3(-0.2,-0.64) 4(0.2,-0.64) 5(0.6,-0.64) 6(1,-0.64) 7(1,0.64) 8(0.6,0.64) 9(0.2,0.64) 10(-0.2,0.64) 11(-0.6,0.64) 12(-1,0.64)
  rect 2.2x0.4 smd: CP(0,0)
Top Overlay:
  circle w0: c-1.4,-1 r0.15
Top Paste:
  rectangle: -0.75,-0.15 -0.35,0.15
  rectangle: 0.35,-0.15 0.75,0.15
Top Solder:
  rectangle: -1.16,-0.94 1.16,-0.34
  rectangle: -1.16,0.34 1.16,0.94
  rectangle: -1.15,-0.25 1.15,0.25
Mechanical 16:
  rectangle: -1.25,-0.7 0,0
  lines w0.127: -1.25,-0.7 -1.25,0.7 1.25,0.7 1.25,-0.7 -1.25,-0.7